# Altium integrated library Wurth Electronik Pin Headers 6130xx21121.IntLib: 130 symbols (part 1 of 2)
Pins are listed as number, name and electrical type; pins without a type are passive.

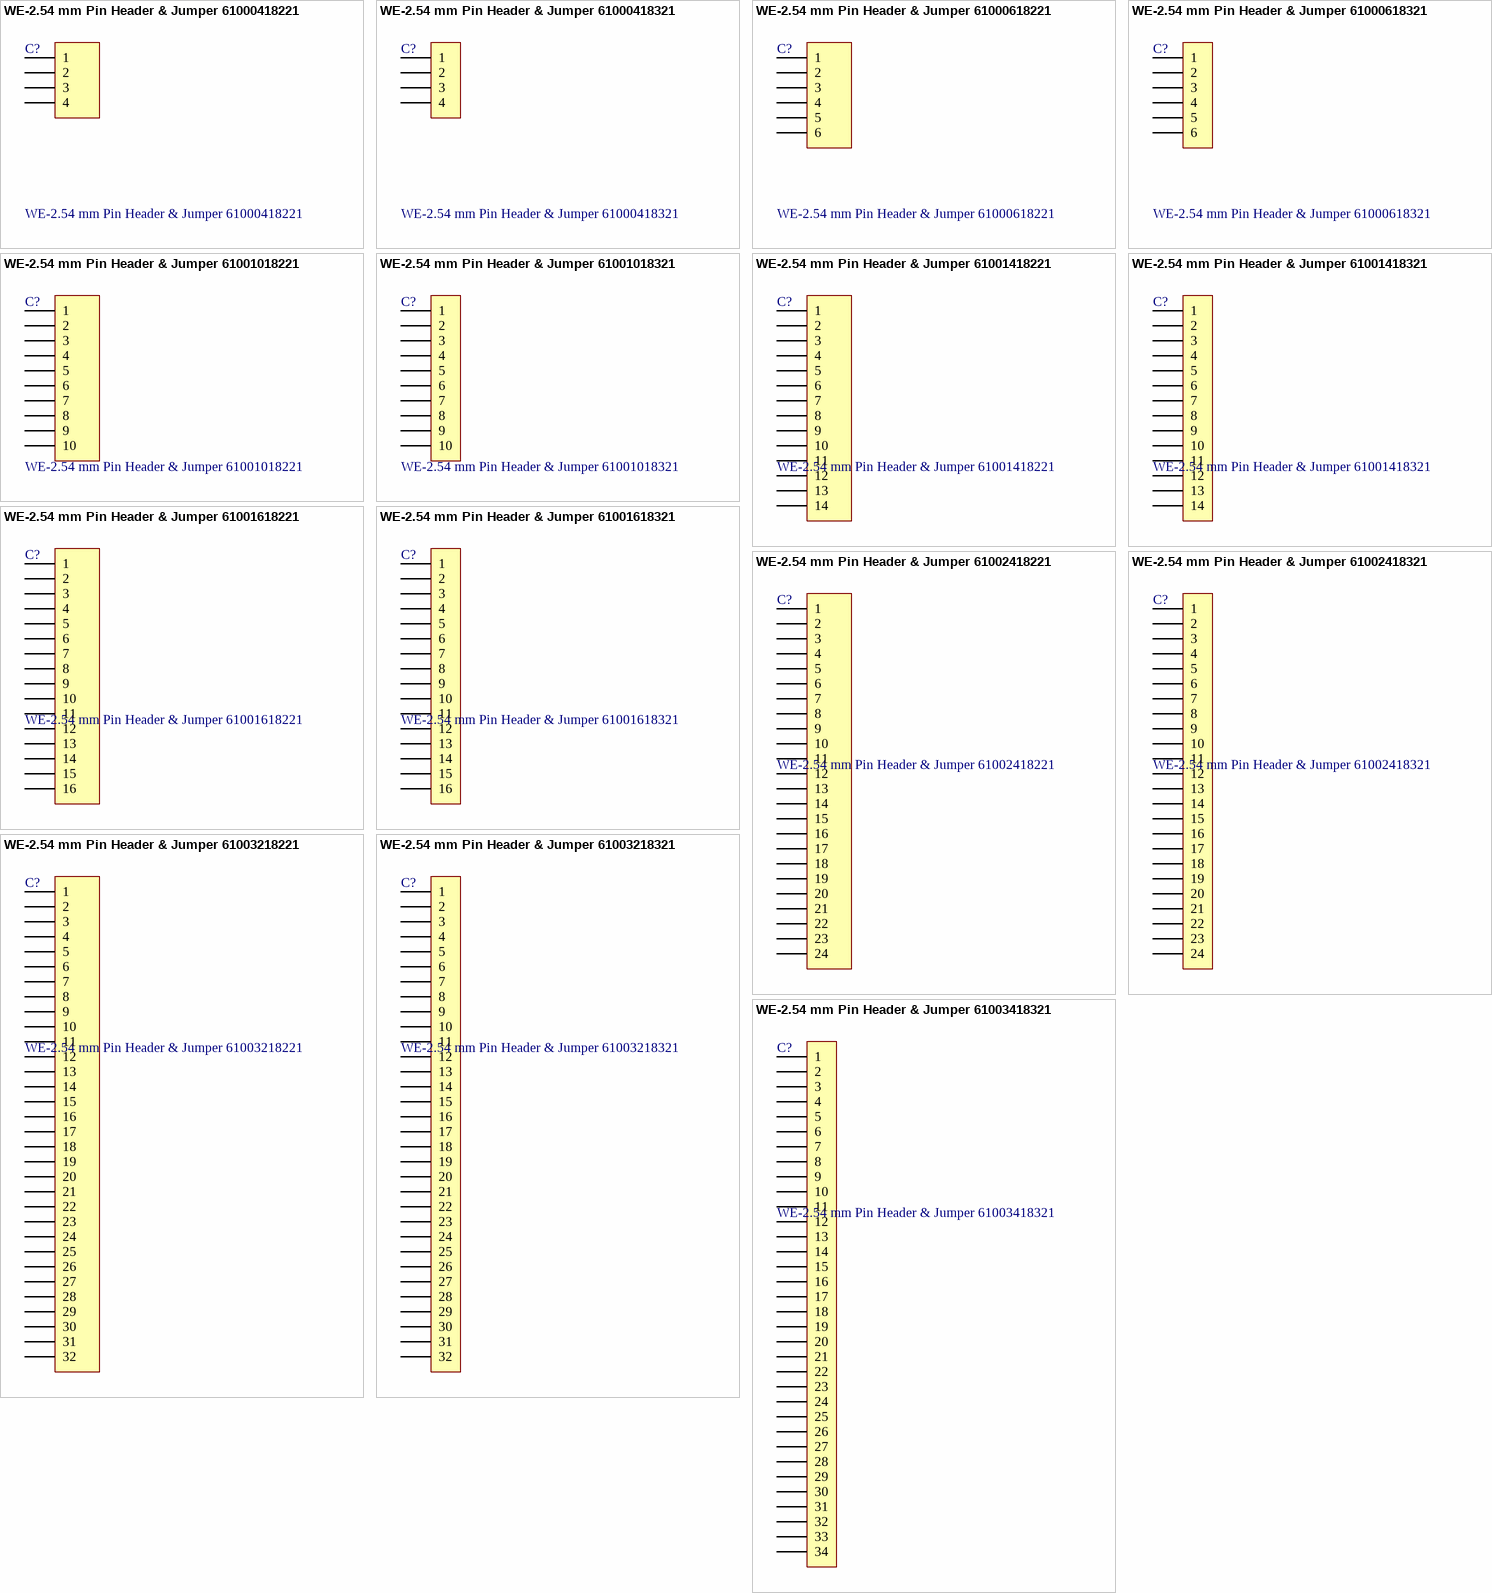
[diagram p0: symbols WE-2.54 mm Pin Header & Jumper 61000418221 to WE-2.54 mm Pin Header & Jumper 61003418321]

## WE-2.54 mm Pin Header & Jumper 61000418221
designator C?
WR-PHD 2.54 mm SMT Pin Header; Manufacturer: Würth Elektronik eiSos GmbH; ComponentLink1 Description: Manufacturer; ComponentLink2 Description: Datasheet; NoPins: 04; Created Date: 26 March 2013; partNo: 61000418221; ComponentLink1URL: http://www.we-online.com; ComponentLink2URL: http://katalog.we-online.de/em/datasheet/6100xx18221.pdf; Created by: Karrer Zheng
footprint 61000418221 (SMT, 4 pins, 1 row, straight, Type 1, gold plating)
pins: 1, 2, 3, 4

## WE-2.54 mm Pin Header & Jumper 61000418321
designator C?
WR-PHD 2.54 mm SMT Pin Header; Manufacturer: Würth Elektronik eiSos GmbH; ComponentLink1 Description: Manufacturer; ComponentLink2 Description: Datasheet; NoPins: 04; Created Date: 26 March 2013; partNo: 61000418321; ComponentLink1URL: http://www.we-online.com; ComponentLink2URL: http://katalog.we-online.de/em/datasheet/6100xx18221.pdf; Created by: Karrer Zheng
footprint 61000418321 (SMT, 4 pins, 1 row, straight, Type 2, gold plating)
pins: 1, 2, 3, 4

## WE-2.54 mm Pin Header & Jumper 61000618221
designator C?
WR-PHD 2.54 mm SMT Pin Header; Manufacturer: Würth Elektronik eiSos GmbH; ComponentLink1 Description: Manufacturer; ComponentLink2 Description: Datasheet; NoPins: 06; Created Date: 26 March 2013; partNo: 61000618221; ComponentLink1URL: http://www.we-online.com; ComponentLink2URL: http://katalog.we-online.de/em/datasheet/6100xx18221.pdf; Created by: Karrer Zheng
footprint 61000618221 (SMT, 6 pins, 1 row, straight, Type 1, gold plating)
pins: 1, 2, 3, 4, 5, 6

## WE-2.54 mm Pin Header & Jumper 61000618321
designator C?
WR-PHD 2.54 mm SMT Pin Header; Manufacturer: Würth Elektronik eiSos GmbH; ComponentLink1 Description: Manufacturer; ComponentLink2 Description: Datasheet; NoPins: 06; Created Date: 26 March 2013; partNo: 61000618321; ComponentLink1URL: http://www.we-online.com; ComponentLink2URL: http://katalog.we-online.de/em/datasheet/6100xx18221.pdf; Created by: Karrer Zheng
footprint 61000618321 (SMT, 6 pins, 1 row, straight, Type 2, gold plating)
pins: 1, 2, 3, 4, 5, 6

## WE-2.54 mm Pin Header & Jumper 61001018221
designator C?
WR-PHD 2.54 mm SMT Pin Header; Manufacturer: Würth Elektronik eiSos GmbH; ComponentLink1 Description: Manufacturer; ComponentLink2 Description: Datasheet; NoPins: 10; Created Date: 26 March 2013; partNo: 61001018221; ComponentLink1URL: http://www.we-online.com; ComponentLink2URL: http://katalog.we-online.de/em/datasheet/6100xx18221.pdf; Created by: Karrer Zheng
footprint 61001018221 (SMT, 10 pins, 1 row, straight, Type 1, gold plating)
pins: 1, 2, 3, 4, 5, 6, 7, 8, 9, 10

## WE-2.54 mm Pin Header & Jumper 61001018321
designator C?
WR-PHD 2.54 mm SMT Pin Header; Manufacturer: Würth Elektronik eiSos GmbH; ComponentLink1 Description: Manufacturer; ComponentLink2 Description: Datasheet; NoPins: 10; Created Date: 26 March 2013; partNo: 61001018321; ComponentLink1URL: http://www.we-online.com; ComponentLink2URL: http://katalog.we-online.de/em/datasheet/6100xx18221.pdf; Created by: Karrer Zheng
footprint 61001018321 (SMT, 10 pins, 1 row, straight, Type 2, gold plating)
pins: 1, 2, 3, 4, 5, 6, 7, 8, 9, 10

## WE-2.54 mm Pin Header & Jumper 61001418221
designator C?
WR-PHD 2.54 mm SMT Pin Header; Manufacturer: Würth Elektronik eiSos GmbH; ComponentLink1 Description: Manufacturer; ComponentLink2 Description: Datasheet; NoPins: 14; Created Date: 26 March 2013; partNo: 61001418221; ComponentLink1URL: http://www.we-online.com; ComponentLink2URL: http://katalog.we-online.de/em/datasheet/6100xx18221.pdf; Created by: Karrer Zheng
footprint 61001418221 (SMT, 14 pins, 1 row, straight, Type 1, gold plating)
pins: 1, 2, 3, 4, 5, 6, 7, 8, 9, 10, 11, 12, 13, 14

## WE-2.54 mm Pin Header & Jumper 61001418321
designator C?
WR-PHD 2.54 mm SMT Pin Header; Manufacturer: Würth Elektronik eiSos GmbH; ComponentLink1 Description: Manufacturer; ComponentLink2 Description: Datasheet; NoPins: 14; Created Date: 26 March 2013; partNo: 61001418321; ComponentLink1URL: http://www.we-online.com; ComponentLink2URL: http://katalog.we-online.de/em/datasheet/6100xx18221.pdf; Created by: Karrer Zheng
footprint 61001418321 (SMT, 14 pins, 1 row, straight, Type 2, gold plating)
pins: 1, 2, 3, 4, 5, 6, 7, 8, 9, 10, 11, 12, 13, 14

## WE-2.54 mm Pin Header & Jumper 61001618221
designator C?
WR-PHD 2.54 mm SMT Pin Header; Manufacturer: Würth Elektronik eiSos GmbH; ComponentLink1 Description: Manufacturer; ComponentLink2 Description: Datasheet; NoPins: 16; Created Date: 26 March 2013; partNo: 61001618221; ComponentLink1URL: http://www.we-online.com; ComponentLink2URL: http://katalog.we-online.de/em/datasheet/6100xx18221.pdf; Created by: Karrer Zheng
footprint 61001618221 (SMT, 16 pins, 1 row, straight, Type 1, gold plating)
pins: 1, 2, 3, 4, 5, 6, 7, 8, 9, 10, 11, 12, 13, 14, 15, 16

## WE-2.54 mm Pin Header & Jumper 61001618321
designator C?
WR-PHD 2.54 mm SMT Pin Header; Manufacturer: Würth Elektronik eiSos GmbH; ComponentLink1 Description: Manufacturer; ComponentLink2 Description: Datasheet; NoPins: 16; Created Date: 26 March 2013; partNo: 61001618321; ComponentLink1URL: http://www.we-online.com; ComponentLink2URL: http://katalog.we-online.de/em/datasheet/6100xx18221.pdf; Created by: Karrer Zheng
footprint 61001618321 (SMT, 16 pins, 1 row, straight, Type 2, gold plating)
pins: 1, 2, 3, 4, 5, 6, 7, 8, 9, 10, 11, 12, 13, 14, 15, 16

## WE-2.54 mm Pin Header & Jumper 61002418221
designator C?
WR-PHD 2.54 mm SMT Pin Header; Manufacturer: Würth Elektronik eiSos GmbH; ComponentLink1 Description: Manufacturer; ComponentLink2 Description: Datasheet; NoPins: 24; Created Date: 26 March 2013; partNo: 61002418221; ComponentLink1URL: http://www.we-online.com; ComponentLink2URL: http://katalog.we-online.de/em/datasheet/6100xx18221.pdf; Created by: Karrer Zheng
footprint 61002418221 (SMT, 24 pins, 1 row, straight, Type 1, gold plating)
pins: 1, 2, 3, 4, 5, 6, 7, 8, 9, 10, 11, 12, 13, 14, 15, 16, 17, 18, 19, 20, 21, 22, 23, 24

## WE-2.54 mm Pin Header & Jumper 61002418321
designator C?
WR-PHD 2.54 mm SMT Pin Header; Manufacturer: Würth Elektronik eiSos GmbH; ComponentLink1 Description: Manufacturer; ComponentLink2 Description: Datasheet; NoPins: 24; Created Date: 26 March 2013; partNo: 61002418321; ComponentLink1URL: http://www.we-online.com; ComponentLink2URL: http://katalog.we-online.de/em/datasheet/6100xx18221.pdf; Created by: Karrer Zheng
footprint 61002418321 (SMT, 24 pins, 1 row, straight, Type 2, gold plating)
pins: 1, 2, 3, 4, 5, 6, 7, 8, 9, 10, 11, 12, 13, 14, 15, 16, 17, 18, 19, 20, 21, 22, 23, 24

## WE-2.54 mm Pin Header & Jumper 61003218221
designator C?
WR-PHD 2.54 mm SMT Pin Header; Manufacturer: Würth Elektronik eiSos GmbH; ComponentLink1 Description: Manufacturer; ComponentLink2 Description: Datasheet; NoPins: 32; Created Date: 26 March 2013; partNo: 61003218221; ComponentLink1URL: http://www.we-online.com; ComponentLink2URL: http://katalog.we-online.de/em/datasheet/6100xx18221.pdf; Created by: Karrer Zheng
footprint 61003218221 (SMT, 32 pins, 1 row, straight, Type 1, gold plating)
pins: 1, 2, 3, 4, 5, 6, 7, 8, 9, 10, 11, 12, 13, 14, 15, 16, 17, 18, 19, 20, 21, 22, 23, 24, 25, 26, 27, 28, 29, 30, 31, 32

## WE-2.54 mm Pin Header & Jumper 61003218321
designator C?
WR-PHD 2.54 mm SMT Pin Header; Manufacturer: Würth Elektronik eiSos GmbH; ComponentLink1 Description: Manufacturer; ComponentLink2 Description: Datasheet; NoPins: 32; Created Date: 26 March 2013; partNo: 61003218321; ComponentLink1URL: http://www.we-online.com; ComponentLink2URL: http://katalog.we-online.de/em/datasheet/6100xx18221.pdf; Created by: Karrer Zheng
footprint 61003218321 (SMT, 32 pins, 1 row, straight, Type 2, gold plating)
pins: 1, 2, 3, 4, 5, 6, 7, 8, 9, 10, 11, 12, 13, 14, 15, 16, 17, 18, 19, 20, 21, 22, 23, 24, 25, 26, 27, 28, 29, 30, 31, 32

## WE-2.54 mm Pin Header & Jumper 61003418321
designator C?
WR-PHD 2.54 mm SMT Pin Header; Manufacturer: Würth Elektronik eiSos GmbH; ComponentLink1 Description: Manufacturer; ComponentLink2 Description: Datasheet; NoPins: 34; Created Date: 26 March 2013; partNo: 61003418321; ComponentLink1URL: http://www.we-online.com; ComponentLink2URL: http://katalog.we-online.de/em/datasheet/6100xx18221.pdf; Created by: Karrer Zheng
footprint 61003418321 (SMT, 34 pins, 1 row, straight, Type 2, gold plating)
pins: 1, 2, 3, 4, 5, 6, 7, 8, 9, 10, 11, 12, 13, 14, 15, 16, 17, 18, 19, 20, 21, 22, 23, 24, 25, 26, 27, 28, 29, 30, 31, 32, 33, 34

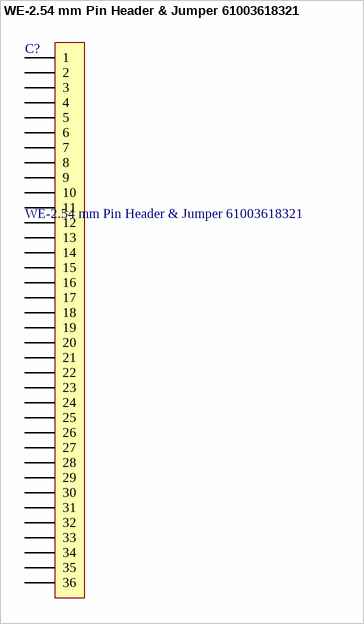
[diagram p1: symbol WE-2.54 mm Pin Header & Jumper 61003618321]

## WE-2.54 mm Pin Header & Jumper 61003618321
designator C?
WR-PHD 2.54 mm SMT Pin Header; Manufacturer: Würth Elektronik eiSos GmbH; ComponentLink1 Description: Manufacturer; ComponentLink2 Description: Datasheet; NoPins: 36; Created Date: 26 March 2013; partNo: 61003618321; ComponentLink1URL: http://www.we-online.com; ComponentLink2URL: http://katalog.we-online.de/em/datasheet/6100xx18221.pdf; Created by: Karrer Zheng
footprint 61003618321 (SMT, 36 pins, 1 row, straight, Type 2, gold plating)
pins: 1, 2, 3, 4, 5, 6, 7, 8, 9, 10, 11, 12, 13, 14, 15, 16, 17, 18, 19, 20, 21, 22, 23, 24, 25, 26, 27, 28, 29, 30, 31, 32, 33, 34, 35, 36


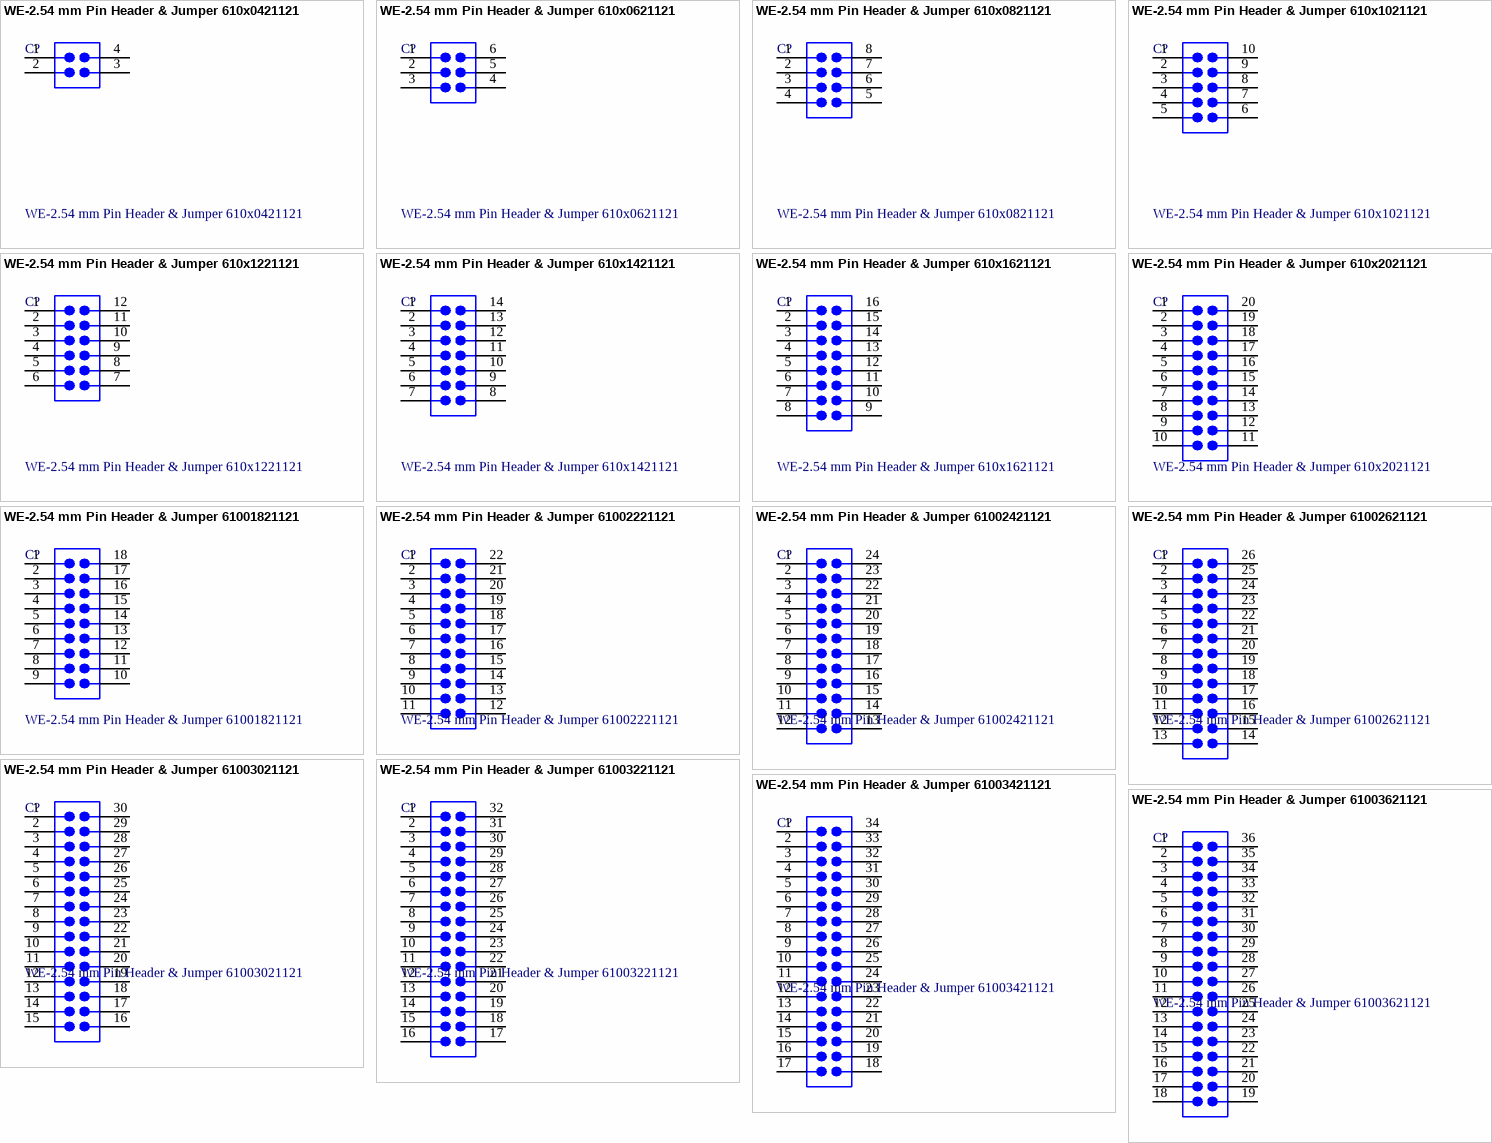
[diagram p2: symbols WE-2.54 mm Pin Header & Jumper 610x0421121 to WE-2.54 mm Pin Header & Jumper 61003621121]

## WE-2.54 mm Pin Header & Jumper 610x0421121
designator C?
WR-PHD 2.54 mm Dual SMT Pin Header; Manufacturer: Würth Elektronik eiSos GmbH; ComponentLink1 Description: Manufacturer; ComponentLink2 Description: Datasheet; NoPins: 04; Created Date: 22 March 2013; partNo: 610x0421121; ComponentLink1URL: http://www.we-online.com; ComponentLink2URL: http://katalog.we-online.de/em/datasheet/6100xx21121.pdf; Created by: Karrer Zheng
footprint 610x0421121 (SMT, 4 pins, dual row, straight, gold plating)
pins: 1, 2, 3, 4

## WE-2.54 mm Pin Header & Jumper 610x0621121
designator C?
WR-PHD 2.54 mm Dual SMT Pin Header; Manufacturer: Würth Elektronik eiSos GmbH; ComponentLink1 Description: Manufacturer; ComponentLink2 Description: Datasheet; NoPins: 06; Created Date: 22 March 2013; partNo: 610x0621121; ComponentLink1URL: http://www.we-online.com; ComponentLink2URL: http://katalog.we-online.de/em/datasheet/6100xx21121.pdf; Created by: Karrer Zheng
footprint 610x0621121 (SMT, 6 pins, dual row, straight, gold plating)
pins: 1, 2, 3, 4, 5, 6

## WE-2.54 mm Pin Header & Jumper 610x0821121
designator C?
WR-PHD 2.54 mm Dual SMT Pin Header; Manufacturer: Würth Elektronik eiSos GmbH; ComponentLink1 Description: Manufacturer; ComponentLink2 Description: Datasheet; NoPins: 08; Created Date: 22 March 2013; partNo: 610x0821121; ComponentLink1URL: http://www.we-online.com; ComponentLink2URL: http://katalog.we-online.de/em/datasheet/6100xx21121.pdf; Created by: Karrer Zheng
footprint 610x0821121 (SMT, 8 pins, dual row, straight, gold plating)
pins: 1, 2, 3, 4, 5, 6, 7, 8

## WE-2.54 mm Pin Header & Jumper 610x1021121
designator C?
WR-PHD 2.54 mm Dual SMT Pin Header; Manufacturer: Würth Elektronik eiSos GmbH; ComponentLink1 Description: Manufacturer; ComponentLink2 Description: Datasheet; NoPins: 10; Created Date: 22 March 2013; partNo: 610x1021121; ComponentLink1URL: http://www.we-online.com; ComponentLink2URL: http://katalog.we-online.de/em/datasheet/6100xx21121.pdf; Created by: Karrer Zheng
footprint 610x1021121 (SMT, 10 pins, dual row, straight, gold plating)
pins: 1, 2, 3, 4, 5, 6, 7, 8, 9, 10

## WE-2.54 mm Pin Header & Jumper 610x1221121
designator C?
WR-PHD 2.54 mm Dual SMT Pin Header; Manufacturer: Würth Elektronik eiSos GmbH; ComponentLink1 Description: Manufacturer; ComponentLink2 Description: Datasheet; NoPins: 12; Created Date: 22 March 2013; partNo: 610x1221121; ComponentLink1URL: http://www.we-online.com; ComponentLink2URL: http://katalog.we-online.de/em/datasheet/6100xx21121.pdf; Created by: Karrer Zheng
footprint 610x1221121 (SMT, 12  pins, dual row, straight, gold plating)
pins: 1, 2, 3, 4, 5, 6, 7, 8, 9, 10, 11, 12

## WE-2.54 mm Pin Header & Jumper 610x1421121
designator C?
WR-PHD 2.54 mm Dual SMT Pin Header; Manufacturer: Würth Elektronik eiSos GmbH; ComponentLink1 Description: Manufacturer; ComponentLink2 Description: Datasheet; NoPins: 14; Created Date: 22 March 2013; partNo: 610x1421121; ComponentLink1URL: http://www.we-online.com; ComponentLink2URL: http://katalog.we-online.de/em/datasheet/6100xx21121.pdf; Created by: Karrer Zheng
footprint 610x1421121 (SMT, 14 pins, dual row, straight, gold plating)
pins: 1, 2, 3, 4, 5, 6, 7, 8, 9, 10, 11, 12, 13, 14

## WE-2.54 mm Pin Header & Jumper 610x1621121
designator C?
WR-PHD 2.54 mm Dual SMT Pin Header; Manufacturer: Würth Elektronik eiSos GmbH; ComponentLink1 Description: Manufacturer; ComponentLink2 Description: Datasheet; NoPins: 16; Created Date: 22 March 2013; partNo: 610x1621121; ComponentLink1URL: http://www.we-online.com; ComponentLink2URL: http://katalog.we-online.de/em/datasheet/6100xx21121.pdf; Created by: Karrer Zheng
footprint 610x1621121 (SMT, 16 pins, dual row, straight, gold plating)
pins: 1, 2, 3, 4, 5, 6, 7, 8, 9, 10, 11, 12, 13, 14, 15, 16

## WE-2.54 mm Pin Header & Jumper 610x2021121
designator C?
WR-PHD 2.54 mm Dual SMT Pin Header; Manufacturer: Würth Elektronik eiSos GmbH; ComponentLink1 Description: Manufacturer; ComponentLink2 Description: Datasheet; NoPins: 20; Created Date: 22 March 2013; partNo: 610x2021121; ComponentLink1URL: http://www.we-online.com; ComponentLink2URL: http://katalog.we-online.de/em/datasheet/6100xx21121.pdf; Created by: Karrer Zheng
footprint 610x2021121 (SMT, 20 pins, dual row, straight, gold plating)
pins: 1, 2, 3, 4, 5, 6, 7, 8, 9, 10, 11, 12, 13, 14, 15, 16, 17, 18, 19, 20

## WE-2.54 mm Pin Header & Jumper 61001821121
designator C?
WR-PHD 2.54 mm Dual SMT Pin Header; Manufacturer: Würth Elektronik eiSos GmbH; ComponentLink1 Description: Manufacturer; ComponentLink2 Description: Datasheet; NoPins: 18; Created Date: 22 March 2013; partNo: 61001821121; ComponentLink1URL: http://www.we-online.com; ComponentLink2URL: http://katalog.we-online.de/em/datasheet/6100xx21121.pdf; Created by: Karrer Zheng
footprint 61001821121 (SMT, 18 pins, dual row, straight, gold plating)
pins: 1, 2, 3, 4, 5, 6, 7, 8, 9, 10, 11, 12, 13, 14, 15, 16, 17, 18

## WE-2.54 mm Pin Header & Jumper 61002221121
designator C?
WR-PHD 2.54 mm Dual SMT Pin Header; Manufacturer: Würth Elektronik eiSos GmbH; ComponentLink1 Description: Manufacturer; ComponentLink2 Description: Datasheet; NoPins: 22; Created Date: 22 March 2013; partNo: 61002221121; ComponentLink1URL: http://www.we-online.com; ComponentLink2URL: http://katalog.we-online.de/em/datasheet/6100xx21121.pdf; Created by: Karrer Zheng
footprint 61002221121 (SMT, 22 pins, dual row, straight, gold plating)
pins: 1, 2, 3, 4, 5, 6, 7, 8, 9, 10, 11, 12, 13, 14, 15, 16, 17, 18, 19, 20, 21, 22

## WE-2.54 mm Pin Header & Jumper 61002421121
designator C?
WR-PHD 2.54 mm Dual SMT Pin Header; Manufacturer: Würth Elektronik eiSos GmbH; ComponentLink1 Description: Manufacturer; ComponentLink2 Description: Datasheet; NoPins: 24; Created Date: 22 March 2013; partNo: 61002421121; ComponentLink1URL: http://www.we-online.com; ComponentLink2URL: http://katalog.we-online.de/em/datasheet/6100xx21121.pdf; Created by: Karrer Zheng
footprint 61002421121 (SMT, 24 pins, dual row, straight, gold plating)
pins: 1, 2, 3, 4, 5, 6, 7, 8, 9, 10, 11, 12, 13, 14, 15, 16, 17, 18, 19, 20, 21, 22, 23, 24

## WE-2.54 mm Pin Header & Jumper 61002621121
designator C?
WR-PHD 2.54 mm Dual SMT Pin Header; Manufacturer: Würth Elektronik eiSos GmbH; ComponentLink1 Description: Manufacturer; ComponentLink2 Description: Datasheet; NoPins: 26; Created Date: 22 March 2013; partNo: 61002621121; ComponentLink1URL: http://www.we-online.com; ComponentLink2URL: http://katalog.we-online.de/em/datasheet/6100xx21121.pdf; Created by: Karrer Zheng
footprint 61002621121 (SMT, 26 pins, dual row, straight, gold plating)
pins: 1, 2, 3, 4, 5, 6, 7, 8, 9, 10, 11, 12, 13, 14, 15, 16, 17, 18, 19, 20, 21, 22, 23, 24, 25, 26

## WE-2.54 mm Pin Header & Jumper 61003021121
designator C?
WR-PHD 2.54 mm Dual SMT Pin Header; Manufacturer: Würth Elektronik eiSos GmbH; ComponentLink1 Description: Manufacturer; ComponentLink2 Description: Datasheet; NoPins: 30; Created Date: 22 March 2013; partNo: 61003021121; ComponentLink1URL: http://www.we-online.com; ComponentLink2URL: http://katalog.we-online.de/em/datasheet/6100xx21121.pdf; Created by: Karrer Zheng
footprint 61003021121 (SMT, 30 pins, dual row, straight, gold plating)
pins: 1, 2, 3, 4, 5, 6, 7, 8, 9, 10, 11, 12, 13, 14, 15, 16, 17, 18, 19, 20, 21, 22, 23, 24, 25, 26, 27, 28, 29, 30

## WE-2.54 mm Pin Header & Jumper 61003221121
designator C?
WR-PHD 2.54 mm Dual SMT Pin Header; Manufacturer: Würth Elektronik eiSos GmbH; ComponentLink1 Description: Manufacturer; ComponentLink2 Description: Datasheet; NoPins: 32; Created Date: 22 March 2013; partNo: 61003221121; ComponentLink1URL: http://www.we-online.com; ComponentLink2URL: http://katalog.we-online.de/em/datasheet/6100xx21121.pdf; Created by: Karrer Zheng
footprint 61003221121 (SMT, 32 pins, dual row, straight, gold plating)
pins: 1, 2, 3, 4, 5, 6, 7, 8, 9, 10, 11, 12, 13, 14, 15, 16, 17, 18, 19, 20, 21, 22, 23, 24, 25, 26, 27, 28, 29, 30, 31, 32

## WE-2.54 mm Pin Header & Jumper 61003421121
designator C?
WR-PHD 2.54 mm Dual SMT Pin Header; Manufacturer: Würth Elektronik eiSos GmbH; ComponentLink1 Description: Manufacturer; ComponentLink2 Description: Datasheet; NoPins: 34; Created Date: 22 March 2013; partNo: 61003421121; ComponentLink1URL: http://www.we-online.com; ComponentLink2URL: http://katalog.we-online.de/em/datasheet/6100xx21121.pdf; Created by: Karrer Zheng
footprint 61003421121 (SMT, 34 pins, dual row, straight, gold plating)
pins: 1, 2, 3, 4, 5, 6, 7, 8, 9, 10, 11, 12, 13, 14, 15, 16, 17, 18, 19, 20, 21, 22, 23, 24, 25, 26, 27, 28, 29, 30, 31, 32, 33, 34

## WE-2.54 mm Pin Header & Jumper 61003621121
designator C?
WR-PHD 2.54 mm Dual SMT Pin Header; Manufacturer: Würth Elektronik eiSos GmbH; ComponentLink1 Description: Manufacturer; ComponentLink2 Description: Datasheet; NoPins: 36; Created Date: 22 March 2013; partNo: 61003621121; ComponentLink1URL: http://www.we-online.com; ComponentLink2URL: http://katalog.we-online.de/em/datasheet/6100xx21121.pdf; Created by: Karrer Zheng
footprint 61003621121 (SMT, 36 pins, dual row, straight, gold plating)
pins: 1, 2, 3, 4, 5, 6, 7, 8, 9, 10, 11, 12, 13, 14, 15, 16, 17, 18, 19, 20, 21, 22, 23, 24, 25, 26, 27, 28, 29, 30, 31, 32, 33, 34, 35, 36

